# Altium footprint library Connector.PcbLib: 536 footprints (part 20 of 34)
Each footprint in its own frame and in the unit in brackets; x right, y up, seen from the top. Pads: shape width x height; smd on the part's side, far side on the other; paste and mask are expansions set on the pad; w line width, h text height; cw(c..) or ccw(c..) is an arc to the next point about the centre after c.
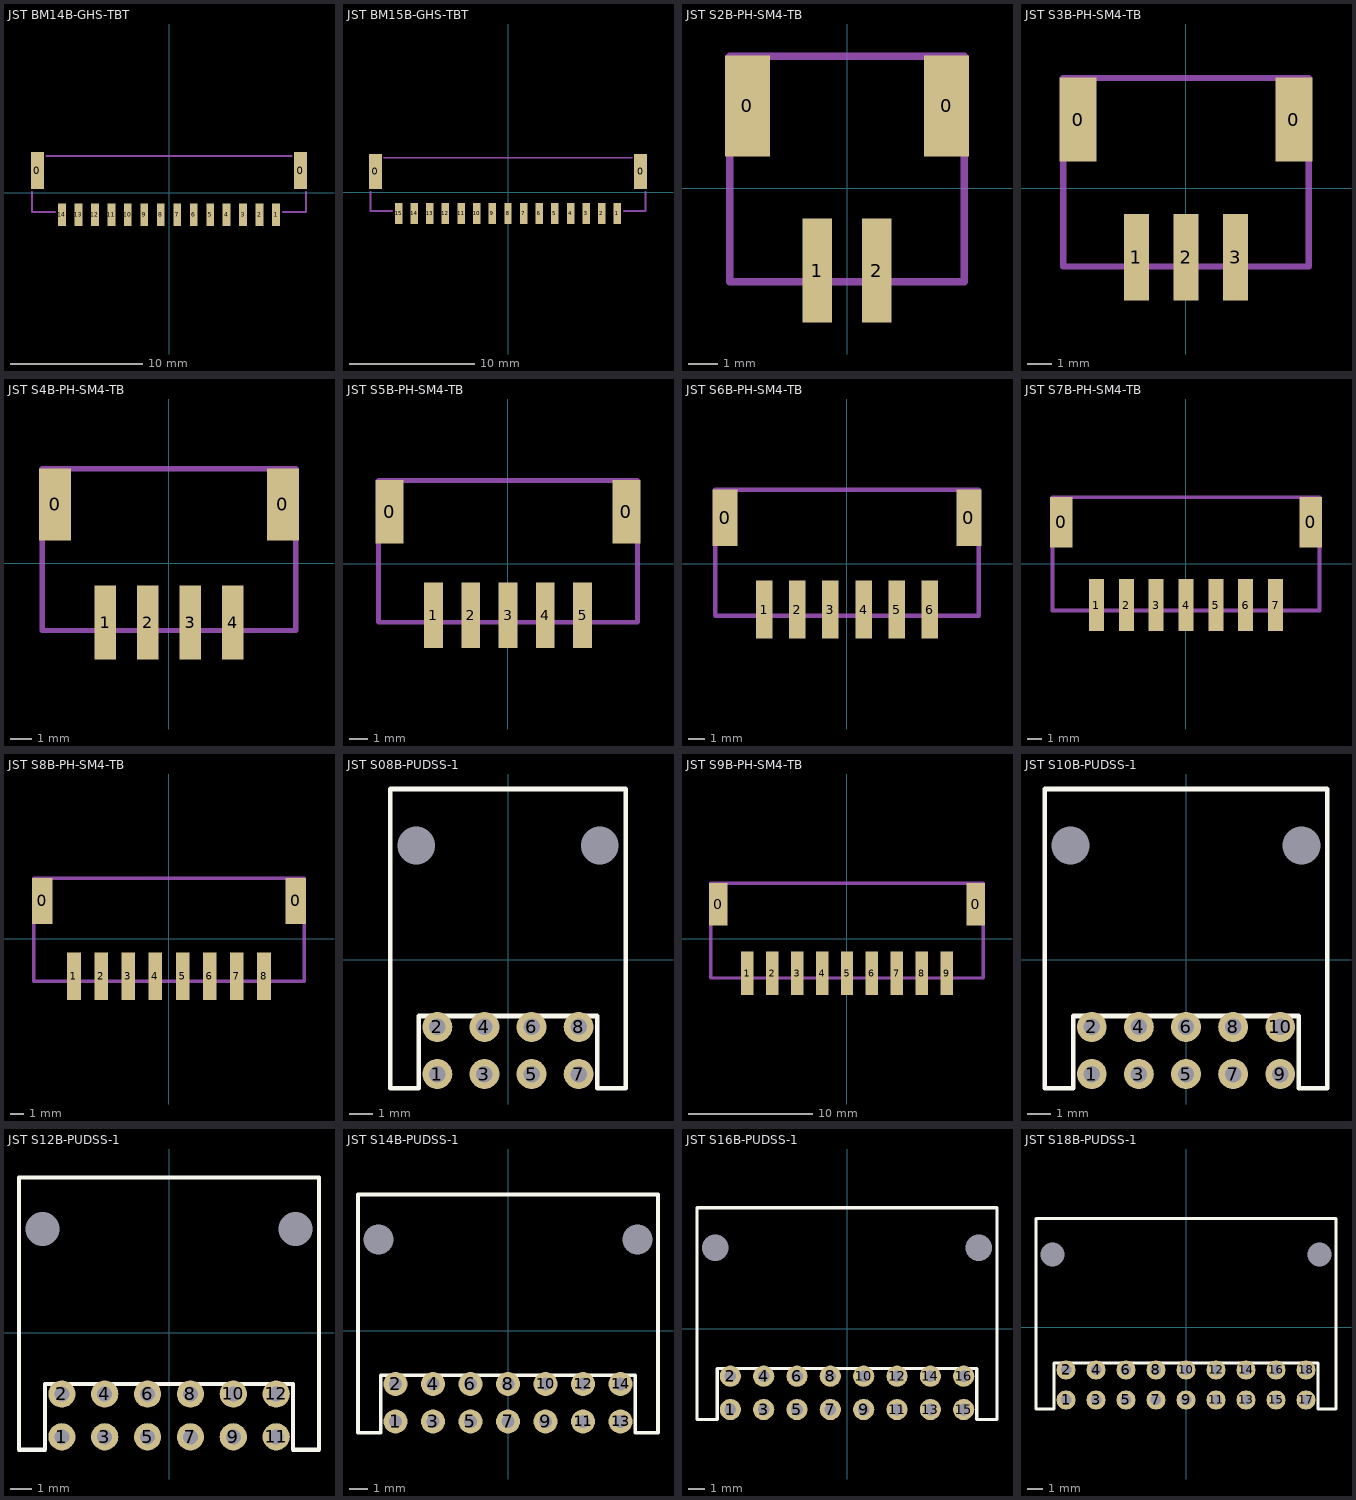
[diagram p19: the footprints below, top view; thin cyan lines are the x and y axes]

## JST BM14B-GHS-TBT [mm]
pads (16):
  rect 1x2.8 smd: 0(-9.975,1.675) 0(9.975,1.675)
  rect 0.6x1.7 smd: 1(8.125,-1.675) 2(6.875,-1.675) 3(5.625,-1.675) 4(4.375,-1.675) 5(3.125,-1.675) 6(1.875,-1.675) 7(0.625,-1.675) 8(-0.625,-1.675) 9(-1.875,-1.675) 10(-3.125,-1.675) 11(-4.375,-1.675) 12(-5.625,-1.675) 13(-6.875,-1.675) 14(-8.125,-1.675)
Mechanical 15:
  lines w0.15: -10.375,0.052 -10.375,-1.475 -8.658,-1.475 ; -9.3,2.775 -4.452,2.775 ; -8.048,2.775 -3.2,2.775 ; -6.798,2.775 -1.95,2.775 ; -5.548,2.775 -0.7,2.775 ; -4.298,2.775 0.55,2.775 ; -3.048,2.775 1.8,2.775 ; -1.798,2.775 3.05,2.775 ; -0.548,2.775 4.3,2.775 ; 0.702,2.775 5.55,2.775 ; 1.952,2.775 6.8,2.775 ; 3.202,2.775 8.05,2.775 ; 4.452,2.775 9.3,2.775 ; 8.658,-1.475 10.375,-1.475 10.375,0.052
3D body "BM14B-GHS-TBT.STEP": height 4.23, standoff 0.02, extent -10.375,-2.175 10.375,2.775

## JST BM15B-GHS-TBT [mm]
pads (17):
  rect 1x2.8 smd: 0(-10.6,1.675) 0(10.6,1.675)
  rect 0.6x1.7 smd: 1(8.75,-1.675) 2(7.5,-1.675) 3(6.25,-1.675) 4(5,-1.675) 5(3.75,-1.675) 6(2.5,-1.675) 7(1.25,-1.675) 8(0,-1.675) 9(-1.25,-1.675) 10(-2.5,-1.675) 11(-3.75,-1.675) 12(-5,-1.675) 13(-6.25,-1.675) 14(-7.5,-1.675) 15(-8.75,-1.675)
Mechanical 15:
  lines w0.15: -11,0.052 -11,-1.475 -9.283,-1.475 ; -9.925,2.775 -5.077,2.775 ; -8.673,2.775 -3.825,2.775 ; -7.423,2.775 -2.575,2.775 ; -6.173,2.775 -1.325,2.775 ; -4.923,2.775 -0.075,2.775 ; -3.673,2.775 1.175,2.775 ; -2.423,2.775 2.425,2.775 ; -1.173,2.775 3.675,2.775 ; 0.077,2.775 4.925,2.775 ; 1.327,2.775 6.175,2.775 ; 2.577,2.775 7.425,2.775 ; 3.827,2.775 8.675,2.775 ; 5.077,2.775 9.925,2.775 ; 9.283,-1.475 11,-1.475 11,0.052
3D body "BM15B-GHS-TBT.STEP": height 4.23, standoff 0.02, extent -11,-2.175 11,2.775

## JST S2B-PH-SM4-TB [mm]
pads (4):
  rect 1.5x3.4 smd: 0(-3.35,2.775) 0(3.35,2.775)
  rect 1x3.5 smd: 1(-1,-2.775) 2(1,-2.775)
Mechanical 15:
  lines w0.254: -3.95,-3.15 -3.95,4.45 3.95,4.45 3.95,-3.15 -3.95,-3.15
3D body "S2B-PH-SM4-TB.STEP": height 5.6, standoff 0, extent -3.95,-4.146 3.95,4.454

## JST S3B-PH-SM4-TB [mm]
pads (5):
  rect 1.5x3.4 smd: 0(-4.35,2.775) 0(4.35,2.775)
  rect 1x3.5 smd: 1(-2,-2.775) 2(0,-2.775) 3(2,-2.775)
Mechanical 15:
  lines w0.254: -4.95,-3.15 4.95,-3.15 4.95,4.45 -4.95,4.45 -4.95,-3.15
3D body "S3B-PH-SM4-TB.STEP": height 5.6, standoff 0, extent -4.95,-4.146 4.95,4.454

## JST S4B-PH-SM4-TB [mm]
pads (6):
  rect 1.5x3.4 smd: 0(-5.35,2.775) 0(5.35,2.775)
  rect 1x3.5 smd: 1(-3,-2.775) 2(-1,-2.775) 3(1,-2.775) 4(3,-2.775)
Mechanical 15:
  lines w0.254: -5.95,-3.15 5.95,-3.15 5.95,4.45 -5.95,4.45 -5.95,-3.15
3D body "S4B-PH-SM4-TB.STEP": height 5.6, standoff 0, extent -5.95,-4.146 5.95,4.454

## JST S5B-PH-SM4-TB [mm]
pads (7):
  rect 1.5x3.4 smd: 0(-6.35,2.775) 0(6.35,2.775)
  rect 1x3.5 smd: 1(-4,-2.775) 2(-2,-2.775) 3(0,-2.775) 4(2,-2.775) 5(4,-2.775)
Mechanical 15:
  lines w0.254: -6.95,-3.15 6.95,-3.15 6.95,4.45 -6.95,4.45 -6.95,-3.15
3D body "S5B-PH-SM4-TB.STEP": height 5.6, standoff 0, extent -6.95,-4.146 6.95,4.454

## JST S6B-PH-SM4-TB [mm]
pads (8):
  rect 1.5x3.4 smd: 0(-7.35,2.775) 0(7.35,2.775)
  rect 1x3.5 smd: 1(-5,-2.775) 2(-3,-2.775) 3(-1,-2.775) 4(1,-2.775) 5(3,-2.775) 6(5,-2.775)
Mechanical 15:
  lines w0.254: -7.95,-3.15 7.95,-3.15 7.95,4.45 -7.95,4.45 -7.95,-3.15
3D body "S6B-PH-SM4-TB.STEP": height 5.6, standoff 0, extent -7.95,-4.146 7.95,4.454

## JST S7B-PH-SM4-TB [mm]
pads (9):
  rect 1.5x3.4 smd: 0(-8.35,2.775) 0(8.35,2.775)
  rect 1x3.5 smd: 1(-6,-2.775) 2(-4,-2.775) 3(-2,-2.775) 4(0,-2.775) 5(2,-2.775) 6(4,-2.775) 7(6,-2.775)
Mechanical 15:
  lines w0.254: -8.95,-3.15 -8.95,4.45 8.95,4.45 8.95,-3.15 -8.95,-3.15
3D body "S7B-PH-SM4-TB.STEP": height 5.6, standoff 0, extent -8.95,-4.146 8.95,4.454

## JST S8B-PH-SM4-TB [mm]
pads (10):
  rect 1.5x3.4 smd: 0(-9.35,2.775) 0(9.35,2.775)
  rect 1x3.5 smd: 1(-7,-2.775) 2(-5,-2.775) 3(-3,-2.775) 4(-1,-2.775) 5(1,-2.775) 6(3,-2.775) 7(5,-2.775) 8(7,-2.775)
Mechanical 15:
  lines w0.254: -9.95,-3.15 -9.95,4.45 9.95,4.45 9.95,-3.15 -9.95,-3.15
3D body "S8B-PH-SM4-TB.STEP": height 5.6, standoff 0, extent -9.95,-4.146 9.95,4.454

## JST S08B-PUDSS-1 [mm]
pads (10):
  round 0 hole 1.6: 0(-3.9,4.85) 0(3.9,4.85)
  round 1.27 hole 0.7: 1(-3,-4.85) 2(-3,-2.85) 3(-1,-4.85) 4(-1,-2.85) 5(1,-4.85) 6(1,-2.85) 7(3,-4.85) 8(3,-2.85)
Top Overlay:
  lines w0.203: -5,-5.45 -5,7.25 5,7.25 5,-5.45 3.787,-5.45 3.787,-2.386 -3.787,-2.386 -3.787,-5.45 -5,-5.45
3D body "S08B-PUDSS-1.STEP": height 8.52, standoff -2.98, extent -5,-5.45 5,7.25

## JST S9B-PH-SM4-TB [mm]
pads (11):
  rect 1.5x3.4 smd: 0(-10.35,2.775) 0(10.35,2.775)
  rect 1x3.5 smd: 1(-8,-2.775) 2(-6,-2.775) 3(-4,-2.775) 4(-2,-2.775) 5(0,-2.775) 6(2,-2.775) 7(4,-2.775) 8(6,-2.775) 9(8,-2.775)
Mechanical 15:
  lines w0.254: -10.95,-3.15 10.95,-3.15 10.95,4.45 -10.95,4.45 -10.95,-3.15
3D body "S9B-PH-SM4-TB.STEP": height 5.6, standoff 0, extent -10.95,-4.146 10.95,4.454

## JST S10B-PUDSS-1 [mm]
pads (12):
  round 0 hole 1.6: 0(-4.9,4.85) 0(4.9,4.85)
  round 1.27 hole 0.7: 1(-4,-4.85) 2(-4,-2.85) 3(-2,-4.85) 4(-2,-2.85) 5(0,-4.85) 6(0,-2.85) 7(2,-4.85) 8(2,-2.85) 9(4,-4.85) 10(4,-2.85)
Top Overlay:
  lines w0.203: -6,-5.45 -4.787,-5.45 -4.787,-2.386 4.787,-2.386 4.787,-5.45 6,-5.45 6,7.25 -6,7.25 -6,-5.45
3D body "S10B-PUDSS-1.STEP": height 8.52, standoff -2.98, extent -6,-5.45 6,7.25

## JST S12B-PUDSS-1 [mm]
pads (14):
  round 0 hole 1.6: 0(-5.9,4.85) 0(5.9,4.85)
  round 1.27 hole 0.7: 1(-5,-4.85) 2(-5,-2.85) 3(-3,-4.85) 4(-3,-2.85) 5(-1,-4.85) 6(-1,-2.85) 7(1,-4.85) 8(1,-2.85) 9(3,-4.85) 10(3,-2.85) 11(5,-4.85) 12(5,-2.85)
Top Overlay:
  lines w0.203: -7,-5.45 -5.787,-5.45 -5.787,-2.386 5.787,-2.386 5.787,-5.45 7,-5.45 7,7.25 -7,7.25 -7,-5.45
3D body "S12B-PUDSS-1.STEP": height 8.52, standoff -2.98, extent -7,-5.45 7,7.25

## JST S14B-PUDSS-1 [mm]
pads (16):
  round 0 hole 1.6: 0(-6.9,4.85) 0(6.9,4.85)
  round 1.27 hole 0.7: 1(-6,-4.85) 2(-6,-2.85) 3(-4,-4.85) 4(-4,-2.85) 5(-2,-4.85) 6(-2,-2.85) 7(0,-4.85) 8(0,-2.85) 9(2,-4.85) 10(2,-2.85) 11(4,-4.85) 12(4,-2.85) 13(6,-4.85) 14(6,-2.85)
Top Overlay:
  lines w0.203: -8,-5.45 -8,7.25 8,7.25 8,-5.45 6.787,-5.45 6.787,-2.386 -6.787,-2.386 -6.787,-5.45 -8,-5.45
3D body "S14B-PUDSS-1.STEP": height 8.52, standoff -2.98, extent -8,-5.45 8,7.25

## JST S16B-PUDSS-1 [mm]
pads (18):
  round 0 hole 1.6: 0(-7.9,4.85) 0(7.9,4.85)
  round 1.27 hole 0.7: 1(-7,-4.85) 2(-7,-2.85) 3(-5,-4.85) 4(-5,-2.85) 5(-3,-4.85) 6(-3,-2.85) 7(-1,-4.85) 8(-1,-2.85) 9(1,-4.85) 10(1,-2.85) 11(3,-4.85) 12(3,-2.85) 13(5,-4.85) 14(5,-2.85) 15(7,-4.85) 16(7,-2.85)
Top Overlay:
  lines w0.203: -9,-5.45 -7.787,-5.45 -7.787,-2.386 7.787,-2.386 7.787,-5.45 9,-5.45 9,7.25 -9,7.25 -9,-5.45
3D body "S16B-PUDSS-1.STEP": height 8.52, standoff -2.98, extent -9,-5.45 9,7.25

## JST S18B-PUDSS-1 [mm]
pads (20):
  round 0 hole 1.6: 0(-8.9,4.85) 0(8.9,4.85)
  round 1.27 hole 0.7: 1(-8,-4.85) 2(-8,-2.85) 3(-6,-4.85) 4(-6,-2.85) 5(-4,-4.85) 6(-4,-2.85) 7(-2,-4.85) 8(-2,-2.85) 9(0,-4.85) 10(0,-2.85) 11(2,-4.85) 12(2,-2.85) 13(4,-4.85) 14(4,-2.85) 15(6,-4.85) 16(6,-2.85) 17(8,-4.85) 18(8,-2.85)
Top Overlay:
  lines w0.203: -10,-5.45 -10,7.25 10,7.25 10,-5.45 8.787,-5.45 8.787,-2.386 -8.787,-2.386 -8.787,-5.45 -10,-5.45
3D body "S18B-PUDSS-1.STEP": height 8.52, standoff -2.98, extent -10,-5.45 10,7.25